# Altium footprint library MainFPs.PcbLib: 215 footprints (part 12 of 14)
Each footprint in its own frame and in the unit in brackets; x right, y up, seen from the top. Pads: shape width x height; smd on the part's side, far side on the other; paste and mask are expansions set on the pad; w line width, h text height; cw(c..) or ccw(c..) is an arc to the next point about the centre after c.
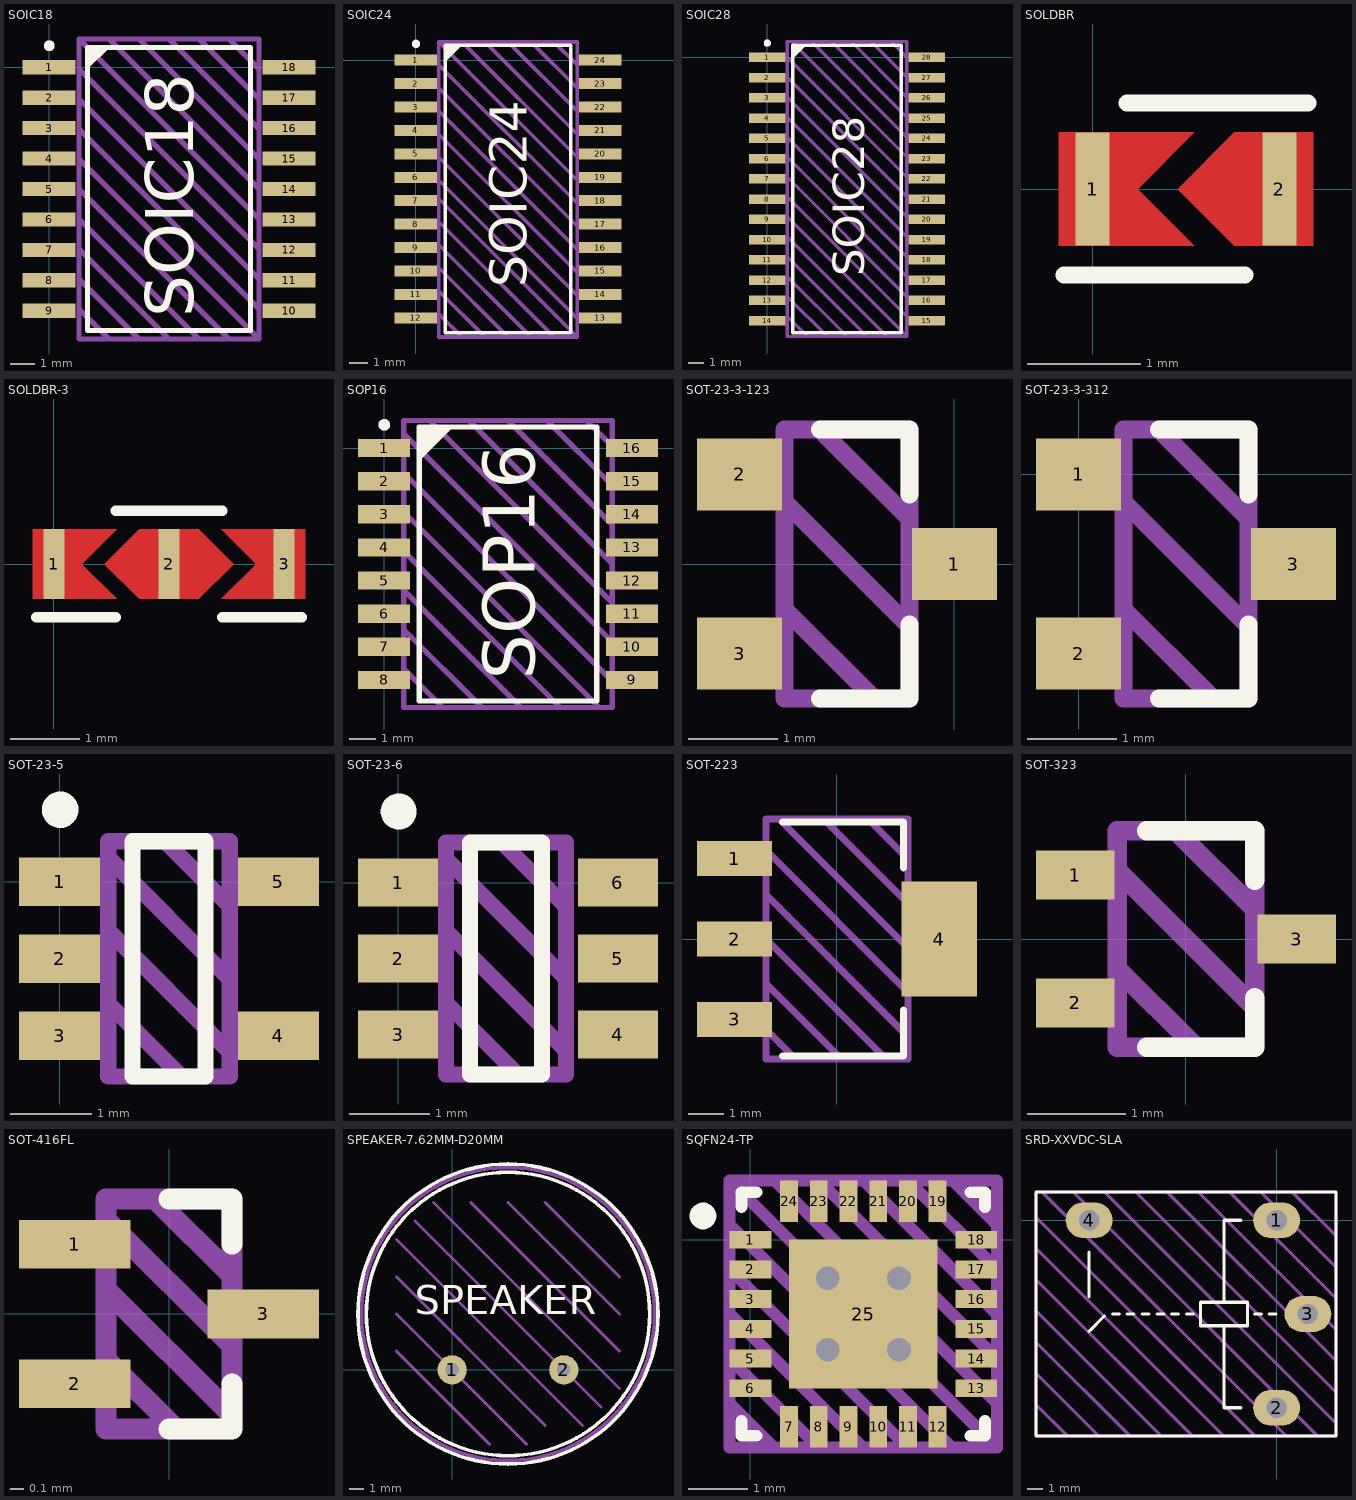
[diagram p11: the footprints below, top view; thin cyan lines are the x and y axes]

## SOIC18 [mm]
height 2.5
pads (18):
  rect 2.2x0.6 smd: 1(0,0) 2(0,-1.27) 3(0,-2.54) 4(0,-3.81) 5(0,-5.08) 6(0,-6.35) 7(0,-7.62) 8(0,-8.89) 9(0,-10.16) 10(10,-10.16) 11(10,-8.89) 12(10,-7.62) 13(10,-6.35) 14(10,-5.08) 15(10,-3.81) 16(10,-2.54) 17(10,-1.27) 18(10,0)
Top Overlay:
  circle w0.25: c0.008,0.889 r0.1
  region: 1.604,0.856 1.604,-0.094 2.554,0.856
  lines w0.2: 1.6,-10.98 8.4,-10.98 8.4,0.82 1.6,0.82 1.6,-10.98
  text "SOIC18" at 6.016,-10.414 h2
Top Draw:
  lines w0.2: 1.25,-10.08 2.5,-11.33 ; 1.25,-8.83 3.75,-11.33 ; 1.25,-7.58 5,-11.33 ; 1.25,-6.33 6.25,-11.33 ; 1.25,-5.08 7.5,-11.33 ; 1.25,-3.83 8.75,-11.33 ; 1.25,-2.58 8.75,-10.08 8.75,-8.83 1.25,-1.33 ; 1.25,-0.08 8.75,-7.58 ; 2.25,1.17 2.5,1.17 8.75,-5.08 ; 3.75,1.17 8.75,-3.83 8.75,-4.58 ; 4.75,1.17 5,1.17 8.75,-2.58 ; 6.25,1.17 8.75,-1.33 8.75,-2.33 ; 7.5,1.17 8.75,-0.08 ; 8.75,-6.58 8.75,-6.33 1.25,1.17 ; 1.25,1.17 8.75,1.17 8.75,-11.33 ; 1.25,1.17 1.25,-11.33 8.75,-11.33
Top Info:
  text "'.Comment'" at 0.047,-12.7 h1
3D body "SOIC18.step": height 2.5, standoff 0, extent -0.208,-10.98 10.208,0.82

## SOIC24 [mm]
height 2.5
pads (24):
  rect 2.3x0.6 smd: 1(0,0) 2(0,-1.27) 3(0,-2.54) 4(0,-3.81) 5(0,-5.08) 6(0,-6.35) 7(0,-7.62) 8(0,-8.89) 9(0,-10.16) 10(0,-11.43) 11(0,-12.7) 12(0,-13.97) 13(10,-13.97) 14(10,-12.7) 15(10,-11.43) 16(10,-10.16) 17(10,-8.89) 18(10,-7.62) 19(10,-6.35) 20(10,-5.08) 21(10,-3.81) 22(10,-2.54) 23(10,-1.27) 24(10,0)
Top Overlay:
  circle w0.25: c0.008,0.889 r0.1
  region: 1.604,0.856 1.604,-0.094 2.554,0.856
  lines w0.2: 1.6,-14.785 1.6,0.815 8.4,0.815 8.4,-14.785 1.6,-14.785
  text "SOIC24" at 6.016,-12.319 h2
Top Draw:
  lines w0.2: 1.25,-13.76 2.5,-15.01 2.75,-15.01 ; 1.25,-12.51 3.75,-15.01 ; 1.25,-11.26 5,-15.01 ; 1.25,-10.01 6.25,-15.01 ; 1.25,-8.76 7.5,-15.01 ; 1.25,-7.51 8.75,-15.01 ; 1.25,-6.51 8.75,-14.01 ; 1.25,-5.26 8.75,-12.76 ; 1.25,-4.01 8.75,-11.51 ; 1.25,-2.76 8.75,-10.26 ; 1.25,-1.26 1.25,-1.51 8.75,-9.01 ; 1.25,-0.01 1.25,-0.26 8.75,-7.76 ; 2.5,0.99 8.75,-5.26 ; 3.75,0.99 8.75,-4.01 ; 5,0.99 8.75,-2.76 ; 6.25,0.99 8.75,-1.51 ; 7.5,0.99 8.75,-0.26 ; 8.75,-6.51 1.25,0.99 ; 1.25,0.99 1.25,-15.01 8.75,-15.01 ; 1.25,0.99 4.5,0.99 8.75,0.99 8.75,-15.01
Top Info:
  text "'.Comment'" at 0.047,-16.38 h1
3D body "SOIC24.step": height 2.5, standoff 0, extent -0.208,-14.8 10.208,0.8

## SOIC28 [mm]
pads (28):
  rect 2.3x0.6 smd: 1(0,0) 2(0,-1.27) 3(0,-2.54) 4(0,-3.81) 5(0,-5.08) 6(0,-6.35) 7(0,-7.62) 8(0,-8.89) 9(0,-10.16) 10(0,-11.43) 11(0,-12.7) 12(0,-13.97) 13(0,-15.24) 14(0,-16.51) 15(10,-16.51) 16(10,-15.24) 17(10,-13.97) 18(10,-12.7) 19(10,-11.43) 20(10,-10.16) 21(10,-8.89) 22(10,-7.62) 23(10,-6.35) 24(10,-5.08) 25(10,-3.81) 26(10,-2.54) 27(10,-1.27) 28(10,0)
Top Overlay:
  circle w0.25: c0.008,0.889 r0.1
  region: 1.604,0.856 1.604,-0.094 2.554,0.856
  lines w0.2: 1.6,-17.272 1.6,0.762 8.4,0.762 8.4,-17.272 1.6,-17.272
  text "SOIC28" at 6.096,-13.716 h2
Top Draw:
  lines w0.2: 1.25,-16.25 2.5,-17.5 2.75,-17.5 ; 1.25,-15 3.75,-17.5 ; 1.25,-13.75 5,-17.5 ; 1.25,-12.5 6.25,-17.5 ; 1.25,-11.25 7.5,-17.5 ; 1.25,-10 8.75,-17.5 ; 1.25,-8.75 8.75,-16.25 ; 1.25,-7.5 8.75,-15 ; 1.25,-6.25 8.75,-13.75 ; 1.25,-5 8.75,-12.5 ; 1.25,-3.75 8.75,-11.25 ; 1.25,-2.5 8.75,-10 ; 1.25,-1.25 8.75,-8.75 ; 1.25,0 8.75,-7.5 ; 1.5,1 8.75,-6.25 8.75,-7 ; 2.75,1 8.75,-5 8.75,-5.25 ; 3.5,1 4,1 8.75,-3.75 ; 4.75,1 5.25,1 8.75,-2.5 ; 5.5,1 6.5,1 8.75,-1.25 ; 7,1 7.75,1 8.75,0 ; 8.75,-17.5 8.75,1 1.25,1 1.25,-17.25 1.25,-17.5 8.75,-17.5
Top Info:
  text "'.Comment'" at 0.047,-18.87 h1
3D body "SOIC281.step": height 2.1, standoff 0, extent -0.208,-17.205 10.208,0.695

## SOLDBR [mm]
pads (2):
  rect 0.3x1 smd: 1(0,0) 2(1.651,0)
Top Layer:
  region: -0.3,0.5 0.9,0.5 0.4,0 0.9,-0.5 -0.3,-0.5
  region: 1.951,0.5 1.251,0.5 0.751,0 1.251,-0.5 1.951,-0.5
Top Overlay:
  lines w0.15: -0.254,-0.762 1.346,-0.762 ; 0.305,0.762 1.905,0.762

## SOLDBR-3 [mm]
pads (3):
  rect 0.3x1 smd: 1(0,0) 2(1.651,0) 3(3.302,0)
Top Layer:
  region: 1.651,0.5 1.226,0.5 0.726,0 1.226,-0.5 1.651,-0.5
  region: 3.602,-0.5 2.402,-0.5 2.902,0 2.402,0.5 3.602,0.5
  region: -0.3,0.5 0.9,0.5 0.4,0 0.9,-0.5 -0.3,-0.5
  region: 1.651,0.5 2.076,0.5 2.576,0 2.076,-0.5 1.651,-0.5
Top Overlay:
  lines w0.15: -0.254,-0.762 0.889,-0.762 ; 0.889,0.762 2.413,0.762 ; 2.413,-0.762 3.556,-0.762

## SOP16 [mm]
height 2.5
pads (16):
  rect 2x0.7 smd: 1(0,0) 2(0,-1.27) 3(0,-2.54) 4(0,-3.81) 5(0,-5.08) 6(0,-6.35) 7(0,-7.62) 8(0,-8.89) 9(9.5,-8.89) 10(9.5,-7.62) 11(9.5,-6.35) 12(9.5,-5.08) 13(9.5,-3.81) 14(9.5,-2.54) 15(9.5,-1.27) 16(9.5,0)
Top Overlay:
  circle w0.25: c0.008,0.889 r0.1
  region: 1.35,0.805 2.634,0.805 1.35,-0.479
  lines w0.2: 1.35,-9.695 1.35,0.805 8.15,0.805 8.15,-9.695 1.35,-9.695
  text "SOP16" at 5.766,-8.89 h2
Top Draw:
  lines w0.2: 0.75,-8.445 2.25,-9.945 2.75,-9.945 ; 0.75,-6.945 3.75,-9.945 4.75,-9.945 ; 0.75,-5.445 5.25,-9.945 6.75,-9.945 ; 0.75,-3.945 6.75,-9.945 ; 0.75,-2.445 8.25,-9.945 8.75,-9.945 ; 0.75,-0.945 8.75,-8.945 ; 0.75,0.555 8.75,-7.445 8.75,-7.945 ; 1.75,1.055 8.75,-5.945 8.75,-6.945 ; 2.25,1.055 3.25,1.055 8.75,-4.445 ; 4.75,1.055 8.75,-2.945 ; 6.25,1.055 8.75,-1.445 8.75,-2.445 ; 7.25,-9.945 6.75,-9.945 ; 7.75,1.055 8.75,0.055 8.75,-0.445 ; 8.75,-9.945 8.75,1.055 0.75,1.055 0.75,-9.945 8.75,-9.945 ; 8.75,-8.945 8.75,-8.945
Top Info:
  text "'.Comment'" at -0.584,-11.557 h1.25
3D body "SOP16.step": height 2.5, standoff 0, extent -0.425,-9.695 9.925,0.805

## SOT-23-3-123 [mm]
pads (3):
  rect 0.95x0.8 smd: 1(0,0) 2(-2.4,1) 3(-2.4,-1)
Top Overlay:
  lines w0.2: -1.5,-1.5 -0.5,-1.5 -0.5,-0.676 ; -1.5,1.5 -0.5,1.5 -0.5,0.776
Top Draw:
  lines w0.2: -1.9,-0.5 -0.9,-1.5 ; -1.9,0.7 -0.5,-0.7 ; -1.5,1.5 -0.5,0.5 ; -1.9,-1.5 -1.9,1.5 -0.5,1.5 -0.5,-1.5 -1.9,-1.5
Top Info:
  text "'.Comment'" at -2.724,-2.286 h0.5
3D body "SOT-23.step": height 1.15, standoff 0, extent -2.5,-1.5 0.1,1.5

## SOT-23-3-312 [mm]
height 1.15
pads (3):
  rect 0.95x0.8 smd: 1(0,0) 2(0,-2) 3(2.4,-1)
Top Overlay:
  lines w0.2: 0.9,-2.5 1.9,-2.5 1.9,-1.676 ; 0.9,0.5 1.9,0.5 1.9,-0.224
Top Draw:
  lines w0.2: 0.5,-1.5 1.5,-2.5 ; 0.5,-0.3 1.9,-1.7 ; 0.9,0.5 1.9,-0.5 ; 0.5,-2.5 1.9,-2.5 1.9,0.5 0.5,0.5 0.5,-2.5
Top Info:
  text "'.Comment'" at -0.324,-3.286 h0.5
3D body "SOT-23.step": height 1.15, standoff 0, extent -0.1,-2.5 2.5,0.5

## SOT-23-5 [mm]
height 1.2
pads (5):
  rect 1x0.6 smd: 1(0,0) 2(0,-0.95) 3(0,-1.9) 4(2.7,-1.9) 5(2.7,0)
Top Overlay:
  circle w0.25: c0.008,0.889 r0.1
  lines w0.2: 0.9,-2.4 1.8,-2.4 1.8,0.5 0.9,0.5 0.9,-2.4
Top Draw:
  lines w0.2: 0.6,-1.5 1.5,-2.4 ; 0.6,-0.6 2.1,-2.1 ; 0.6,0.3 2.1,-1.2 ; 1.3,0.5 2.1,-0.3 ; 0.6,-2.4 2.1,-2.4 2.1,0.5 0.6,0.5 0.6,-2.4
Top Info:
  text "'.Comment'" at -1.066,-3.242 h0.5
3D body "SOT23-5.step": height 1.2, standoff 0, extent -0.15,-2.45 2.85,0.55

## SOT-23-6 [mm]
height 1.1
pads (6):
  rect 1x0.6 smd: 1(0,0) 2(0,-0.95) 3(0,-1.9) 4(2.75,-1.9) 5(2.75,-0.95) 6(2.75,0)
Top Overlay:
  circle w0.25: c0.008,0.889 r0.1
  lines w0.2: 0.9,-2.4 1.8,-2.4 1.8,0.5 0.9,0.5 0.9,-2.4
Top Draw:
  lines w0.2: 0.6,-1.5 1.5,-2.4 ; 0.6,-0.6 2.1,-2.1 ; 0.6,0.3 2.1,-1.2 ; 1.3,0.5 2.1,-0.3 ; 0.6,-2.4 2.1,-2.4 2.1,0.5 0.6,0.5 0.6,-2.4
Top Info:
  text "'.Comment'" at -1.016,-3.192 h0.5
3D body "SOT95P280X110-6N.step": height 1.1, standoff 0, extent -0.125,-2.475 2.875,0.575

## SOT-223 [mm]
height 1.7
pads (4):
  rect 2.15x1 smd: 1(-2.925,2.3) 2(-2.925,0) 3(-2.925,-2.3)
  rect 2.15x3.3 smd: 4(2.925,0)
Top Overlay:
  lines w0.2: -1.55,-3.35 1.55,-3.35 1.905,-3.35 1.905,-2.032 ; -1.55,3.35 1.55,3.35 1.905,3.35 1.905,2.032
Top Draw:
  lines w0.2: -2.032,-2.54 -2.032,-2.588 -1.27,-3.35 ; -2.032,-1.27 0.127,-3.429 0.635,-3.429 ; -2.032,0 1.397,-3.429 2.032,-3.429 ; -2.032,1.27 2.032,-2.794 ; -2.032,2.54 2.032,-1.524 2.032,-1.905 ; -0.762,3.429 -0.381,3.429 2.032,1.016 ; 0.762,3.429 0.889,3.429 2.032,2.286 ; 2.032,-3.111 2.032,-2.794 ; 2.032,-0.254 -1.651,3.429 -2.032,3.429 ; -2.032,3.429 2.032,3.429 2.032,-2.794 ; -2.032,3.429 -2.032,-3.429 2.032,-3.429 ; 2.032,-3.429 2.032,-2.794
Top Info:
  text "'.Comment'" at -3.556,-4.826 h1
3D body "SOT223.step": height 1.7, standoff 0, extent -3.5,-3.35 3.5,3.35

## SOT-323 [mm] "SC-70"
pads (3):
  rect 0.8x0.5 smd: 1(-1.125,0.65) 2(-1.125,-0.65) 3(1.125,0)
Top Overlay:
  lines w0.2: -0.4,-1.1 0.7,-1.1 0.7,-0.6 ; -0.4,1.1 0.7,1.1 0.7,0.6
Top Draw:
  lines w0.2: -0.7,-0.3 0.1,-1.1 ; -0.7,0.7 0.7,-0.7 ; -0.1,1.1 0.7,0.3 ; -0.7,-1.1 0.7,-1.1 0.7,1.1 -0.7,1.1 -0.7,-1.1
3D body "SOT65P235X100-3N.step": height 1, standoff 0, extent -1.2,-1.05 1.2,1.05

## SOT-416FL [mm] "SC-89 (EMT3)"
pads (3):
  rect 0.8x0.35 smd: 1(-0.675,0.5) 2(-0.675,-0.5) 3(0.675,0)
Top Overlay:
  lines w0.15: 0,-0.825 0.45,-0.825 0.45,-0.5 ; 0,0.825 0.45,0.825 0.45,0.5
Top Draw:
  lines w0.15: -0.45,-0.325 0.05,-0.825 ; -0.45,0.175 0.45,-0.725 ; -0.45,0.675 0.45,-0.225 ; -0.1,0.825 0.45,0.275 ; -0.45,-0.825 -0.45,0.825 0.45,0.825 0.45,-0.825 -0.45,-0.825
3D body "SOTFL50P160X73-3N.step": height 0.73, standoff 0, extent -0.8,-0.823 0.8,0.823

## SPEAKER-7.62MM-D20MM [mm]
pads (2):
  round 2 hole 0.9: 1(0,0) 2(7.62,0)
Top Overlay:
  circle w0.25: c3.81,3.81 r10.239
  circle w0.25: c3.81,3.81 r9.672
  text "SPEAKER" at -2.54,3.81 h2
Top Draw:
  circle w0.25: c3.81,3.81 r10
  lines w0.2: -3.81,1.27 2.54,-5.08 ; -3.81,3.81 5.08,-5.08 ; -3.81,6.35 5.08,-2.54 6.35,-3.81 ; -3.81,8.89 8.89,-3.81 ; -2.54,10.16 10.16,-2.54 ; -1.27,11.43 11.43,-1.27 ; 1.27,11.43 11.43,1.27 ; 3.81,11.43 11.43,3.81 ; 6.35,11.43 11.43,6.35
Top Info:
  text "'.Comment'" at -5.08,-8.89 h1.5

## SQFN24-TP [mm]
height 1
pads (25):
  rect 0.7x0.3 smd: 1(0,0) 2(0,-0.5) 3(0,-1) 4(0,-1.5) 5(0,-2) 6(0,-2.5) 13(3.8,-2.5) 14(3.8,-2) 15(3.8,-1.5) 16(3.8,-1) 17(3.8,-0.5) 18(3.8,0)
  rect 0.3x0.7 smd: 7(0.65,-3.15) 8(1.15,-3.15) 9(1.65,-3.15) 10(2.15,-3.15) 11(2.65,-3.15) 12(3.15,-3.15) 19(3.15,0.65) 20(2.65,0.65) 21(2.15,0.65) 22(1.65,0.65) 23(1.15,0.65) 24(0.65,0.65)
  rect 2.5x2.5 all layers, no hole: 25(1.9,-1.25)
via 2.5,-0.65 diameter 0.8 hole 0.4
via 2.5,-1.85 diameter 0.8 hole 0.4
via 1.3,-1.85 diameter 0.8 hole 0.4
via 1.3,-0.65 diameter 0.8 hole 0.4
Top Overlay:
  circle w0.25: c-0.8,0.4 r0.1
  lines w0.2: -0.15,-3.05 -0.15,-3.3 0.1,-3.3 ; -0.15,0.55 -0.15,0.8 0.1,0.8 ; 3.7,-3.3 3.95,-3.3 3.95,-3.05 ; 3.7,0.8 3.95,0.8 3.95,0.55
Top Draw:
  lines w0.2: -0.35,-2.75 0.4,-3.5 ; -0.35,-2 1.15,-3.5 ; -0.35,-1.25 1.9,-3.5 ; -0.35,-0.5 2.65,-3.5 ; -0.35,0.25 3.4,-3.5 ; 0.4,1 4.15,-2.75 ; 1.15,1 4.15,-2 ; 1.9,1 4.15,-1.25 ; 2.65,1 4.15,-0.5 ; 3.4,1 4.15,0.25 ; -0.35,1 4.15,1 4.15,-3.5 ; -0.35,1 -0.35,-3.5 4.15,-3.5 ; -0.35,1 4.15,-3.5
Top Info:
  text "'.Comment'" at -1.286,-4.687 h0.75
3D body "PQFN127P600-8N.step": height 1, standoff 0, extent -0.15,-3.3 3.95,0.8

## SRD-XXVDC-SLA [mm]
pads (4):
  oval 3x2.3 hole 1.3: 1(0,0) 2(0,-12) 3(2,-6) 4(-12,0)
Top Overlay:
  lines w0.2: -12,-7.1 -11.025,-6.125 ; -12,-4.9 -12,-2.05 ; -10.512,-6 -10.075,-6 ; -9.562,-6 -9.125,-6 ; -8.612,-6 -8.175,-6 ; -7.663,-6 -7.225,-6 ; -6.713,-6 -6.275,-6 ; -5.763,-6 -5.325,-6 ; -3.375,-6.75 -3.375,-12 -2.275,-12 ; -3.375,-5.25 -3.375,0 -2.275,0 ; -1.425,-6 -0.987,-6 ; -0.475,-6 -0.038,-6 ; -15.4,-13.8 3.8,-13.8 3.8,1.8 -15.4,1.8 -15.4,-13.8 ; -4.875,-6.75 -4.875,-5.25 -1.875,-5.25 -1.875,-6.75 -4.875,-6.75
Top Draw:
  lines w0.2: -15.4,-11.8 -13.4,-13.8 ; -15.4,-9.8 -11.4,-13.8 ; -15.4,-7.8 -9.4,-13.8 ; -15.4,-5.8 -7.4,-13.8 ; -15.4,-3.8 -5.4,-13.8 ; -15.4,-1.8 -3.4,-13.8 ; -15.4,0.2 -1.4,-13.8 ; -15,1.8 0.6,-13.8 ; -13,1.8 2.6,-13.8 ; -11,1.8 3.8,-13 ; -9,1.8 3.8,-11 ; -7,1.8 3.8,-9 ; -5,1.8 3.8,-7 ; -3,1.8 3.8,-5 ; -1,1.8 3.8,-3 ; 1,1.8 3.8,-1 ; -15.4,-13.8 -15.4,1.8 3.8,1.8 3.8,-13.8 -15.4,-13.8
Top Info:
  text "'.Comment'" at -15.4,-16.7 h2
3D body: height 15.8, standoff 0, extent -15.4,-13.8 3.8,1.8
3D body: height 1, standoff -3, extent 1.8,-6.55 2.2,-5.45
3D body: height 1, standoff -3, extent -0.3,-0.25 0.3,0.25
3D body: height 1, standoff -3, extent -0.3,-12.25 0.3,-11.75
3D body: height 1, standoff -3, extent -12.5,-0.25 -11.5,0.25